# Altium footprint library First Board IMX6.PcbLib: 204 footprints (part 7 of 13)
Each footprint in its own frame and in the unit in brackets; x right, y up, seen from the top. Pads: shape width x height; smd on the part's side, far side on the other; paste and mask are expansions set on the pad; w line width, h text height; cw(c..) or ccw(c..) is an arc to the next point about the centre after c.
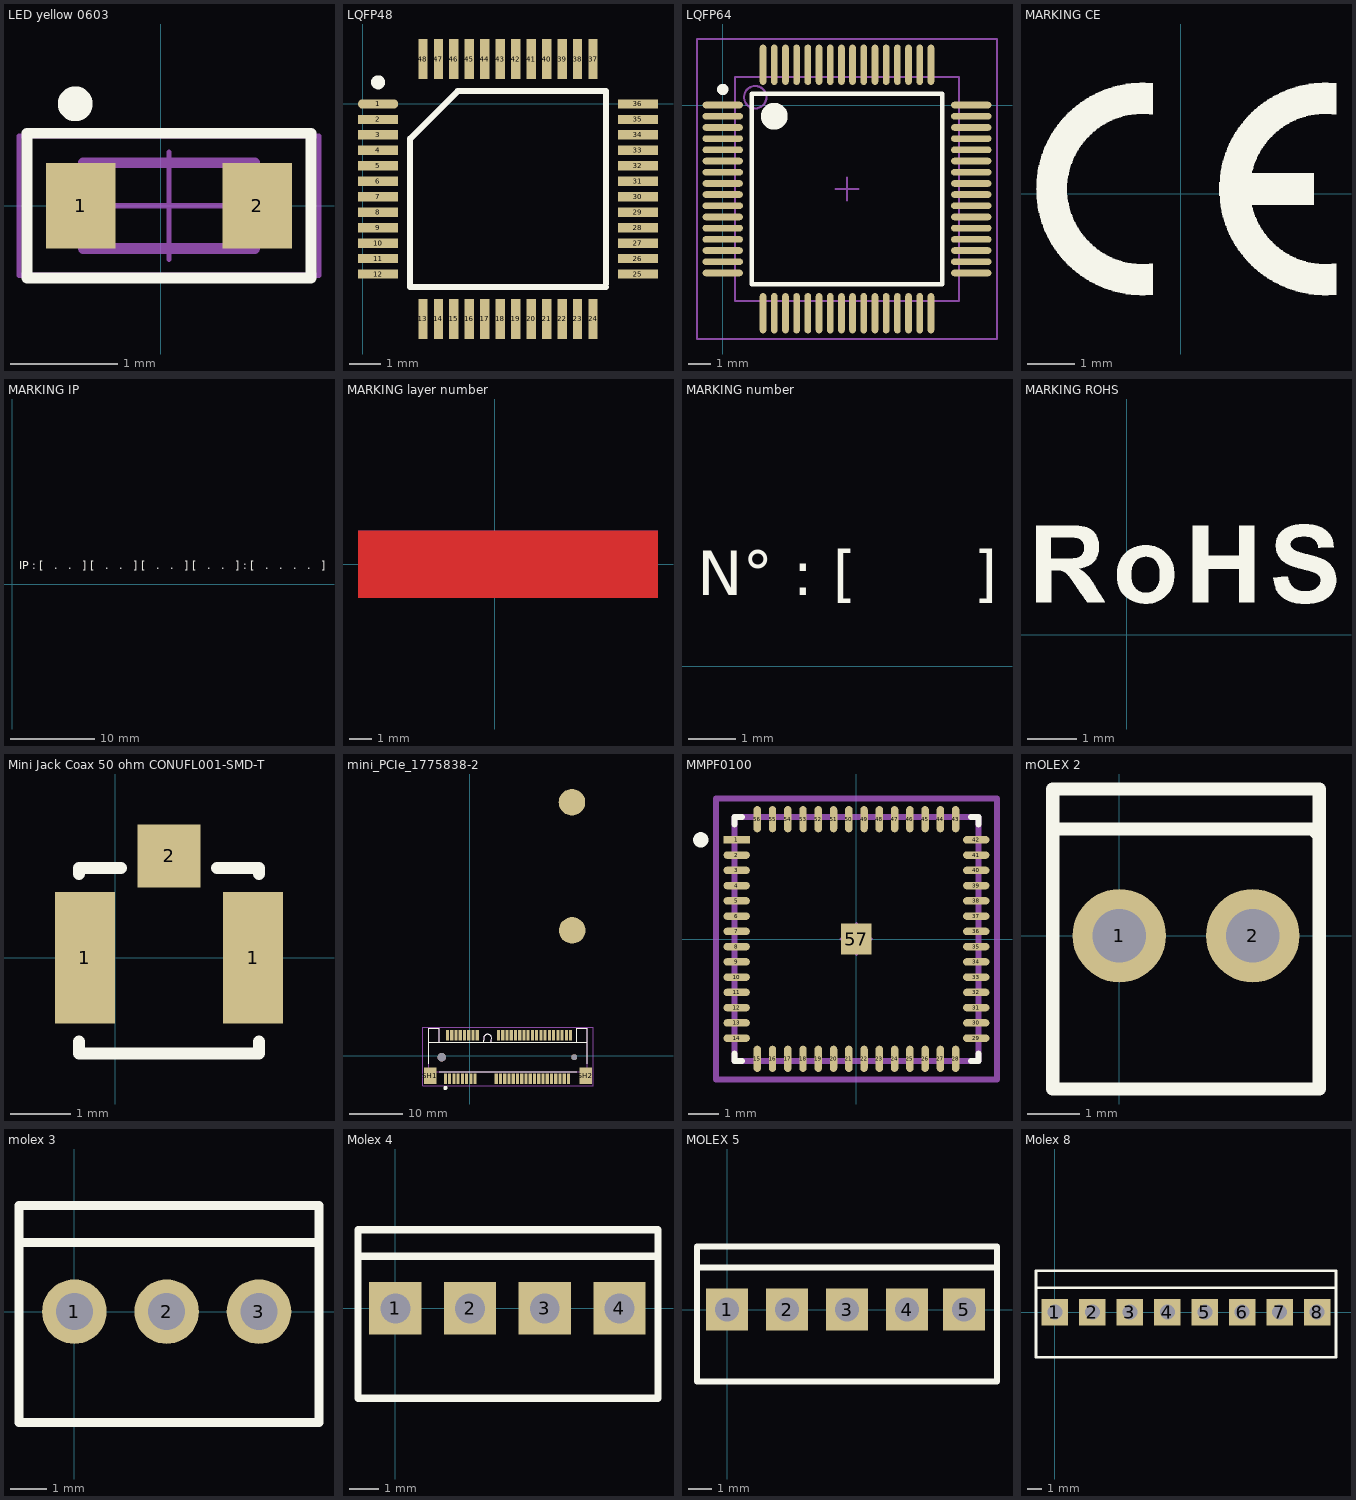
[diagram p6: the footprints below, top view; thin cyan lines are the x and y axes]

## LED yellow 0603 [mm]
pads (2):
  rect 0.65x0.8 smd: 1(-0.75,0) 2(0.9,0)
Top Overlay:
  circle w0.254: c-0.8,0.95 r0.035
  lines w0.1: -1.25,-0.675 -1.25,0.675 1.3,0.675 1.4,0.675 1.4,-0.675 -1.25,-0.675
Mechanical 13:
  lines w0.1: -0.725,-0.4 0.875,-0.4 0.875,0.4 -0.725,0.4 -0.725,-0.4
Mechanical 15:
  lines w0.05: -0.425,0 0.575,0 ; 0.075,-0.5 0.075,0.5 ; -1.325,-0.65 -1.325,0.65 1.475,0.65 1.475,-0.65 -1.325,-0.65
3D body "LED yellow 0603.step": height 0.8, standoff 0, extent -0.7,-0.375 0.9,0.425

## LQFP48 [mm]
pads (48):
  oval 1.3x0.3 smd: 1(0.5,0)
  rect 1.3x0.3 smd: 2(0.5,-0.5) 3(0.5,-1) 4(0.5,-1.5) 5(0.5,-2) 6(0.5,-2.5) 7(0.5,-3) 8(0.5,-3.5) 9(0.5,-4) 10(0.5,-4.5) 11(0.5,-5) 12(0.5,-5.5) 25(8.9,-5.5) 26(8.9,-5) 27(8.9,-4.5) 28(8.9,-4) 29(8.9,-3.5) 30(8.9,-3) 31(8.9,-2.5) 32(8.9,-2) 33(8.9,-1.5) 34(8.9,-1) 35(8.9,-0.5) 36(8.9,0)
  rect 0.3x1.3 smd: 13(1.95,-6.95) 14(2.45,-6.95) 15(2.95,-6.95) 16(3.45,-6.95) 17(3.95,-6.95) 18(4.45,-6.95) 19(4.95,-6.95) 20(5.45,-6.95) 21(5.95,-6.95) 22(6.45,-6.95) 23(6.95,-6.95) 24(7.45,-6.95) 37(7.45,1.45) 38(6.95,1.45) 39(6.45,1.45) 40(5.95,1.45) 41(5.45,1.45) 42(4.95,1.45) 43(4.45,1.45) 44(3.95,1.45) 45(3.45,1.45) 46(2.95,1.45) 47(2.45,1.45) 48(1.95,1.45)
Top Overlay:
  circle w0.254: c0.5,0.7 r0.1
  lines w0.2: 7.865,-5.915 1.535,-5.915 1.535,-1.12 3.07,0.415 7.865,0.415 7.865,-5.815
3D body "LQFP48.STEP": height 1.6, standoff 0, extent 0.199,-7.221 9.199,1.779

## LQFP64 [mm]
pads (64):
  oval 1.8x0.3 smd: 1(0,0) 2(0,-0.5) 3(0,-1) 4(0,-1.5) 5(0,-2) 6(0,-2.5) 7(0,-3) 8(0,-3.5) 9(0,-4) 10(0,-4.5) 11(0,-5) 12(0,-5.5) 13(0,-6) 14(0,-6.5) 15(0,-7) 16(0,-7.5) 33(11.1,-7.5) 34(11.1,-7) 35(11.1,-6.5) 36(11.1,-6) 37(11.1,-5.5) 38(11.1,-5) 39(11.1,-4.5) 40(11.1,-4) 41(11.1,-3.5) 42(11.1,-3) 43(11.1,-2.5) 44(11.1,-2) 45(11.1,-1.5) 46(11.1,-1) 47(11.1,-0.5) 48(11.1,0)
  oval 0.3x1.8 smd: 17(1.8,-9.3) 18(2.3,-9.3) 19(2.8,-9.3) 20(3.3,-9.3) 21(3.8,-9.3) 22(4.3,-9.3) 23(4.8,-9.3) 24(5.3,-9.3) 25(5.8,-9.3) 26(6.3,-9.3) 27(6.8,-9.3) 28(7.3,-9.3) 29(7.8,-9.3) 30(8.3,-9.3) 31(8.8,-9.3) 32(9.3,-9.3) 49(9.3,1.8) 50(8.8,1.8) 51(8.3,1.8) 52(7.8,1.8) 53(7.3,1.8) 54(6.8,1.8) 55(6.3,1.8) 56(5.8,1.8) 57(5.3,1.8) 58(4.8,1.8) 59(4.3,1.8) 60(3.8,1.8) 61(3.3,1.8) 62(2.8,1.8) 63(2.3,1.8) 64(1.8,1.8)
Top Overlay:
  circle w0.25: c0,0.7 r0.125
  circle w0.6: c2.3,-0.5 r0.3
  lines w0.2: 1.3,-8 1.3,0.5 9.8,0.5 9.8,-8 1.3,-8
Mechanical 13:
  circle w0.1: c1.45,0.35 r0.5
  lines w0.1: 0.55,-8.75 0.55,1.25 10.55,1.25 10.55,-8.75 0.55,-8.75
Mechanical 15:
  lines w0.1: 5.05,-3.75 6.05,-3.75 ; 5.55,-4.25 5.55,-3.25 ; -1.15,-10.45 -1.15,2.95 12.25,2.95 12.25,-10.45 -1.15,-10.45
3D body "LQFP64.STEP": height 1.62, standoff -0.01, extent -0.522,-9.897 11.622,2.247

## MARKING CE [mm]
Top Overlay:
  drawing of 2 lines, arcs and shapes, not listed

## MARKING IP [mm]
Top Overlay:
  text "IP : [   .   .   ] [   .   .   ] [   .   .   ] [   .   .   ] : [   .   .   .   .   ]" at 0.832,1.447 h1.6

## MARKING layer number [mm]
Top Layer:
  pour cut-out: -6.138,1.5 7.338,1.5 7.338,-1.503 -6.138,-1.503
  lines w0.254: -6,-1.375 7.225,-1.375 7.225,1.4 -6,1.4 -6,-1.375
  text "1" at -5.421,-0.796 h1.52
L1:
  pour cut-out: -6.138,1.5 7.338,1.5 7.338,-1.503 -6.138,-1.503
  text "3" at -2.746,-0.796 h1.52
L3:
  pour cut-out: -6.138,1.5 7.338,1.5 7.338,-1.503 -6.138,-1.503
  text "4" at -1.071,-0.796 h1.52
L4:
  pour cut-out: -6.138,1.5 7.338,1.5 7.338,-1.503 -6.138,-1.503
  text "5" at 0.504,-0.796 h1.52
L6:
  pour cut-out: -6.138,1.5 7.338,1.5 7.338,-1.503 -6.138,-1.503
  text "6" at 2.054,-0.796 h1.52
L2:
  pour cut-out: -6.138,1.5 7.338,1.5 7.338,-1.503 -6.138,-1.503
  text "2" at -4.396,-0.796 h1.52
L5:
  pour cut-out: -6.138,1.5 7.338,1.5 7.338,-1.503 -6.138,-1.503
  text "7" at 3.754,-0.796 h1.52
Bottom Layer:
  pour cut-out: -6.138,1.5 7.338,1.5 7.338,-1.503 -6.138,-1.503
  lines w0.254: -6,-1.375 7.225,-1.375 7.225,1.4 -6,1.4 -6,-1.375
  text "8" at 5.579,-0.796 h1.52
Top Solder:
  rectangle: -6.125,-1.5 7.35,1.525
Bottom Solder:
  rectangle: -6.125,-1.5 7.35,1.525

## MARKING number [mm]
Top Overlay:
  text "N° : [      ]" at 0.8,1.189 h1.6

## MARKING ROHS [mm]
Top Overlay:
  drawing of 4 lines, arcs and shapes, not listed

## Mini Jack Coax 50 ohm CONUFL001-SMD-T [mm]
pads (3):
  rect 1x2.2 smd: 1(-0.5,0) 1(2.3,0)
  rect 1.05x1.05 smd: 2(0.9,1.7)
Top Overlay:
  lines w0.2: -0.6,-1.4 -0.6,-1.6 2.4,-1.6 2.4,-1.4 ; -0.6,1.4 -0.6,1.5 0.1,1.5 ; 1.7,1.5 2.4,1.5 2.4,1.4
3D body "UFL SMD.stp": height 1.35, standoff 0.1, extent -0.6,-1.6 2.4,1.5

## mini_PCIe_1775838-2 [mm]
pads (58):
  rect 0.6x2 smd: 1(-4.561,-4.354) 2(-4.161,3.846) 3(-3.761,-4.354) 4(-3.361,3.846) 5(-2.961,-4.354) 6(-2.561,3.846) 7(-2.161,-4.354) 8(-1.761,3.846) 9(-1.361,-4.354) 10(-0.961,3.846) 11(-0.561,-4.354) 12(-0.161,3.846) 13(0.239,-4.354) 14(0.639,3.846) 15(1.039,-4.354) 16(1.439,3.846) 17(5.039,-4.354) 18(5.439,3.846) 19(5.839,-4.354) 20(6.239,3.846) 21(6.639,-4.354) 22(7.039,3.846) 23(7.439,-4.354) 24(7.839,3.846) 25(8.239,-4.354) 26(8.639,3.846) 27(9.039,-4.354) 28(9.439,3.846) 29(9.839,-4.354) 30(10.239,3.846) 31(10.639,-4.354) 32(11.039,3.846) 33(11.439,-4.354) 34(11.839,3.846) 35(12.239,-4.354) 36(12.639,3.846) 37(13.039,-4.354) 38(13.439,3.846) 39(13.839,-4.354) 40(14.239,3.846) 41(14.639,-4.354) 42(15.039,3.846) 43(15.439,-4.354) 44(15.839,3.846) 45(16.239,-4.354) 46(16.639,3.846) 47(17.039,-4.354) 48(17.439,3.846) 49(17.839,-4.354) 50(18.239,3.846) 51(18.639,-4.354) 52(19.039,3.846)
  rect 2.3x3.2 smd: SH1(-7.411,-3.754) SH2(21.889,-3.754)
  round 1.6 hole 1.6 unplated: ""(-5.261,-0.254)
  round 5 smd: ""(19.3,47.8) ""(19.339,23.646)
  round 1.1 hole 1.1 unplated: ""(19.739,-0.254)
Top Overlay:
  circle w0.4: c-4.561,-6.054 r0.2
  lines w0.127: -7.711,-1.454 -7.711,2.526 ; -5.761,-3.034 20.239,-3.034 ; 2.704,2.946 2.704,2.526 ; 2.707,2.941 cw(c3.389,3.288) 4.071,2.941 ; 4.074,2.946 4.074,2.526 ; 22.189,-1.454 22.189,2.526 ; -7.711,2.526 -7.711,5.166 -5.711,5.166 -5.711,2.526 ; -7.711,2.526 -5.711,2.526 ; -5.711,2.526 2.704,2.526 ; 2.704,2.526 4.074,2.526 ; 4.074,2.526 20.189,2.526 ; 20.189,2.526 20.189,5.166 22.189,5.166 22.189,2.526 ; 20.189,2.526 22.189,2.526
Mechanical 13:
  lines w0.127: 2.704,2.946 2.704,2.526 ; 2.707,2.941 cw(c3.389,3.288) 4.071,2.941 ; 4.074,2.946 4.074,2.526 ; -7.711,2.526 -7.711,5.166 -5.711,5.166 -5.711,2.526 ; -7.711,2.526 -7.711,-3.034 22.189,-3.034 22.189,2.526 ; -7.711,2.526 -5.711,2.526 ; -5.711,2.526 2.704,2.526 ; 2.704,2.526 4.074,2.526 ; 4.074,2.526 20.189,2.526 ; 20.189,2.526 20.189,5.166 22.189,5.166 22.189,2.526 ; 20.189,2.526 22.189,2.526
Mechanical 15:
  lines w0.05: -8.811,-5.604 -8.811,5.416 23.289,5.416 23.289,-5.604 -8.811,-5.604
3D body "mini_pcie_1775838-2.stp": height 5.58, standoff -0.67, extent -7.65,-4.7 22.25,4.38
3D body "9774010243.stp": height 2.4, standoff 0, extent 17.125,45.628 21.475,49.972
3D body "9774010243.stp": height 2.4, standoff 0, extent 17.125,21.428 21.475,25.772

## MMPF0100 [mm]
pads (57):
  rect 0.861x0.242 smd paste+0 mask+0: 1(-3.926,3.25)
  rrect100% 0.861x0.242 smd paste+0 mask+0: 2(-3.926,2.75) 3(-3.926,2.25) 4(-3.926,1.75) 5(-3.926,1.25) 6(-3.926,0.75) 7(-3.926,0.25) 8(-3.926,-0.25) 9(-3.926,-0.75) 10(-3.926,-1.25) 11(-3.926,-1.75) 12(-3.926,-2.25) 13(-3.926,-2.75) 14(-3.926,-3.25) 29(3.926,-3.25) 30(3.926,-2.75) 31(3.926,-2.25) 32(3.926,-1.75) 33(3.926,-1.25) 34(3.926,-0.75) 35(3.926,-0.25) 36(3.926,0.25) 37(3.926,0.75) 38(3.926,1.25) 39(3.926,1.75) 40(3.926,2.25) 41(3.926,2.75) 42(3.926,3.25)
  rrect100% 0.242x0.861 smd paste+0 mask+0: 15(-3.25,-3.926) 16(-2.75,-3.926) 17(-2.25,-3.926) 18(-1.75,-3.926) 19(-1.25,-3.926) 20(-0.75,-3.926) 21(-0.25,-3.926) 22(0.25,-3.926) 23(0.75,-3.926) 24(1.25,-3.926) 25(1.75,-3.926) 26(2.25,-3.926) 27(2.75,-3.926) 28(3.25,-3.926) 43(3.25,3.926) 44(2.75,3.926) 45(2.25,3.926) 46(1.75,3.926) 47(1.25,3.926) 48(0.75,3.926) 49(0.25,3.926) 50(-0.25,3.926) 51(-0.75,3.926) 52(-1.25,3.926) 53(-1.75,3.926) 54(-2.25,3.926) 55(-2.75,3.926) 56(-3.25,3.926)
  rect 1x1 smd paste-1000 mask+0: 57(0,0)
Top Overlay:
  circle w0.25: c-5.1,3.25 r0.125
  lines w0.2: -4,-3.75 -4,-4 -3.75,-4 ; -4,3.75 -4,4 -3.75,4 ; 3.75,-4 4,-4 4,-3.75 ; 3.75,4 4,4 4,3.75
Top Paste:
  rectangle: -1.475,-1.625 1.475,-0.312
  rectangle: -1.475,0.312 1.475,1.625
Mechanical 10:
  lines w0.2: -4.606,-4.606 4.606,-4.606 4.606,4.606 -4.606,4.606 -4.606,-4.606
  text ".Designator" at 0,0.188 h1
Bottom Assembly:
  lines w0.2: -4,-4 4,-4 4,4 -4,4 -4,-4
Mechanical 15:
  lines w0.1: -0.5,0 0.5,0 ; 0,-0.5 0,0.5
  lines w0.2: -4.606,-4.606 4.606,-4.606 4.606,4.606 -4.606,4.606 -4.606,-4.606
3D body "IC_NXP_Semiconductors_MMPF0100NPAEP_eec.STEP": height 1, standoff 0, extent -4.01,-4.01 4.01,4.01

## mOLEX 2 [mil]
pads (2):
  round 70 hole 40: 1(0,0) 2(100,0)
Top Overlay:
  lines w10: -50,80 145,80 150,75 ; -50,-115 -50,110 150,110 150,-115 -50,-115
3D body "Molex 2 male.step": height 467.5, standoff -132.5, extent -50,-116.99 150,113

## molex 3 [mil]
pads (3):
  round 70 hole 40: 1(0,0) 2(100,0) 3(200,0)
Top Overlay:
  lines w10: -60,75 265,75 ; -60,-120 -60,115 265,115 265,-120 -60,-120
3D body "Molex 3 pines.step": height 464.54, standoff -137.77, extent -60,-120 266.38,116.22

## Molex 4 [mil]
pads (4):
  rect 70x70 hole 40: 1(0,0) 2(100,0) 3(200,0) 4(300,0)
Top Overlay:
  lines w10: -50,70 350.39,70 ; -50,-120 351.57,-120 351.57,-59.81 351.57,52.69 351.57,105 -50,105 -50,-120
3D body "Molex 4 male.step": height 436.87, standoff -163.13, extent -50.39,-116.99 349.61,113

## MOLEX 5 [mil]
pads (5):
  rect 70x70 hole 40: 1(0,0) 2(100,0) 3(200,0) 4(300,0) 5(395,0)
Top Overlay:
  lines w10: -50,70 450,70 ; -50,-120 450,-120 450,105 -50,105 -50,-120
3D body "Molex 5.step": height 477.5, standoff -122.5, extent -50,-120 450,110

## Molex 8 [mil]
pads (8):
  rect 70x70 hole 40: 1(0,0) 2(100,0) 3(200,0) 4(300,0) 5(400,0) 6(500,0) 7(600,0) 8(700,0)
Top Overlay:
  lines w7: 750,65 -50,65 -50,-120 ; -50,-120 -50,110 750,110 750,-120 -50,-120
3D body "molex 8 pin.step": height 467.5, standoff -132.5, extent -50,-120 750,110